# Altium footprint library LUMI_Standard_Auto_Soldering_LIB.PcbLib: 344 footprints (part 3 of 22)
Each footprint in its own frame and in the unit in brackets; x right, y up, seen from the top. Pads: shape width x height; smd on the part's side, far side on the other; paste and mask are expansions set on the pad; w line width, h text height; cw(c..) or ccw(c..) is an arc to the next point about the centre after c.
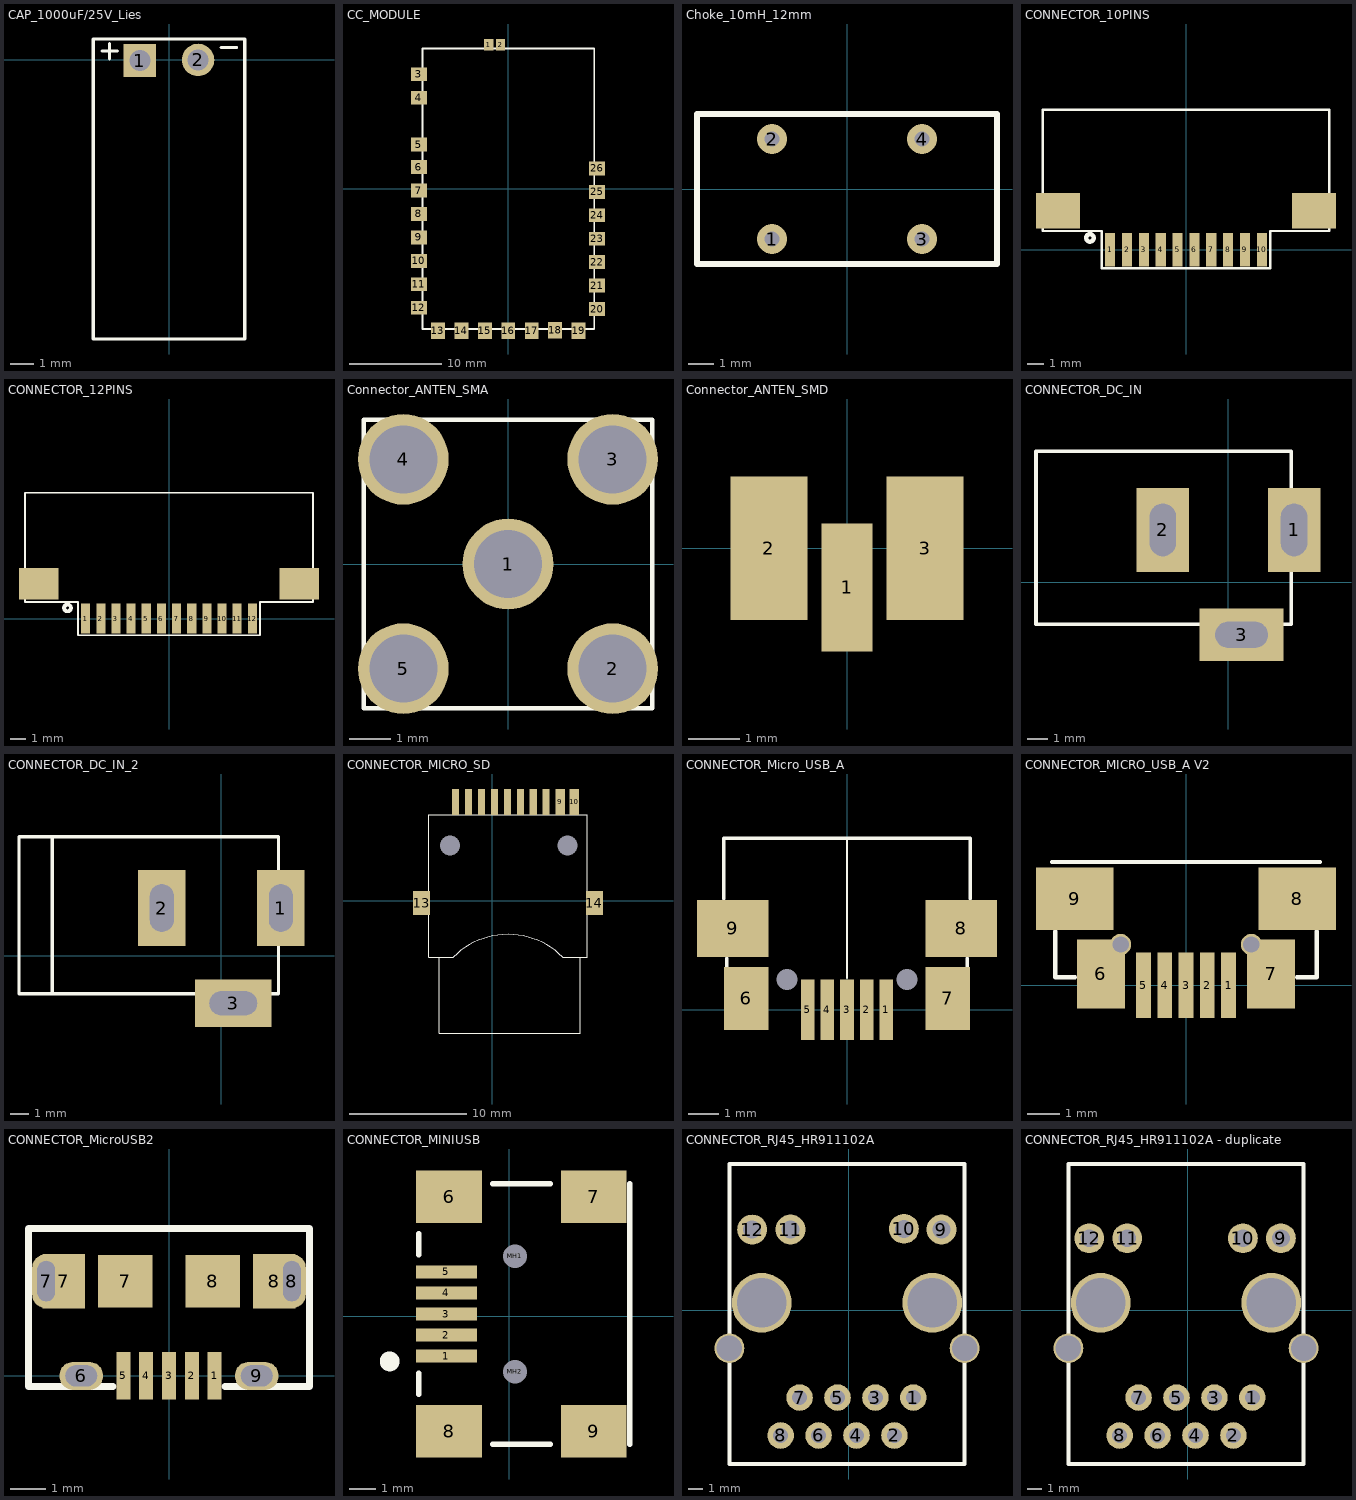
[diagram p2: the footprints below, top view; thin cyan lines are the x and y axes]

## CAP_1000uF/25V_Lies [mm]
pads (2):
  rect 1.4x1.4 hole 0.889: 1(-1.25,-0.025)
  round 1.4 hole 0.889: 2(1.25,0)
Top Overlay:
  lines w0.127: -2.887,0.375 -2.213,0.375 ; -2.55,0.038 -2.55,0.713 ; 2.238,0.525 2.913,0.525
  lines w0.15: -3.25,-12 -3.25,0.9 3.25,0.9 3.25,-12 -3.25,-12
3D body: height 11.95, standoff 0, extent -5.876,-25.1 6.1,0.9
3D body: height 5.99, standoff 0.01, extent -2.976,-12 3,0
3D body: height -0.43, standoff -5.58, extent -2.606,-11.963 2.6,0.763

## CC_MODULE [mm]
pads (26):
  rect 1x1.25 smd mask+0.07: 1(-2.13,15.6) 2(-0.86,15.6)
  rect 1.778x1.5 smd mask+0.07: 3(-9.7,12.4) 4(-9.7,9.86) 5(-9.7,4.78) 6(-9.7,2.34) 7(-9.7,-0.2) 8(-9.7,-2.74) 9(-9.7,-5.28) 10(-9.7,-7.82) 11(-9.7,-10.36) 12(-9.7,-12.9) 20(9.6,-13.04) 21(9.6,-10.5) 22(9.6,-7.96) 23(9.6,-5.42) 24(9.6,-2.88) 25(9.6,-0.34) 26(9.6,2.2)
  rect 1.5x1.778 smd mask+0.07: 13(-7.64,-15.4) 14(-5.1,-15.4) 15(-2.56,-15.4) 16(-0.02,-15.4) 17(2.52,-15.4) 18(5.06,-15.357) 19(7.6,-15.4)
Top Overlay:
  lines w0.2: -9.3,-15.2 -9.3,15.2 9.3,15.2 9.3,-15.2 -9.3,-15.2
3D body: height 2.95, standoff 0.1, extent -9.3,-15.2 9.3,15.2

## Choke_10mH_12mm [mm]
pads (4):
  round 1.2 hole 0.6 mask+0.07: 1(-3,-2) 2(-3,2) 3(3,-2) 4(3,2)
Top Overlay:
  lines w0.254: -6,-3 6,-3 6,3 -6,3 -6,-3
3D body: height 11.99, standoff 0.01, extent -5.976,-3 5.976,3

## CONNECTOR_10PINS [mm] "Dung noi mach cam ung va mach cong suat"
pads (12):
  rect 0.6x2 smd: 1(-4.5,0) 2(-3.5,0) 3(-2.5,0) 4(-1.5,0) 5(-0.5,0) 6(0.5,0) 7(1.5,0) 8(2.5,0) 9(3.5,0) 10(4.5,0)
  rect 2.6x2.1 smd: ""(-7.6,2.3) ""(7.6,2.3)
Top Overlay:
  circle w0.254: c-5.7,0.7 r0.224
  lines w0.127: -8.5,1.1 -8.5,8.3 8.5,8.3 8.5,1.1 5,1.1 5,-1.1 -5,-1.1 -5,1.1 -8.5,1.1
3D body: height 3, standoff 0, extent -8.5,-0.5 8.5,8.2

## CONNECTOR_12PINS [mm]
pads (14):
  rect 0.6x2 smd: 1(-5.5,0) 2(-4.5,0) 3(-3.5,0) 4(-2.5,0) 5(-1.5,0) 6(-0.5,0) 7(0.5,0) 8(1.5,0) 9(2.5,0) 10(3.5,0) 11(4.5,0) 12(5.5,0)
  rect 2.6x2.1 smd: ""(-8.6,2.3) ""(8.6,2.3)
Top Overlay:
  circle w0.254: c-6.7,0.7 r0.224
  lines w0.127: -9.5,1.1 -6,1.1 -6,-1.1 6,-1.1 6,1.1 9.5,1.1 9.5,8.3 -9.5,8.3 -9.5,1.1
3D body: height 3, standoff 0, extent -8.5,-0.5 8.5,8.2

## Connector_ANTEN_SMA [mm]
pads (5):
  round 2.2 hole 1.65: 1(0,0) 2(2.54,-2.54) 3(2.54,2.54) 4(-2.54,2.54)
  round 2.2 hole 1.65 mask+0.102: 5(-2.54,-2.54)
Top Overlay:
  lines w0.102: -3.5,-2.5 -3.5,-2 ; -3.5,2 -3.5,2.5 ; -3.5,-3.5 -3.5,3.5 3.5,3.5 3.5,-3.5 -3.5,-3.5
3D body: height 9.86, standoff -4.24, extent -11.55,-3.5 3.55,3.5

## Connector_ANTEN_SMD [mm]
pads (3):
  rect 1x2.5 smd: 1(0,-0.762)
  rect 1.5x2.8 smd: 2(-1.524,0) 3(1.524,0)
3D body: height 1.5, standoff 0.24, extent -1.524,-1.55 1.476,1.55

## CONNECTOR_DC_IN [mil] "Jac DC input"
height 200
pads (3):
  rect 100x160 hole 50 slot 100 at 90 deg: 1(125,100) 2(-125,100)
  rect 160x100 hole 50 slot 100 at 0 deg: 3(25,-100)
Top Overlay:
  lines w7: -366.81,-80 120,-80 120,250 -366.81,250 -366.81,-80
3D body: height 433.67, standoff -137.2, extent -410.35,-105.12 134,269.12

## CONNECTOR_DC_IN_2 [mil] "Jac DC input"
height 200
pads (3):
  rect 100x160 hole 50 slot 100 at 90 deg: 1(125,100) 2(-125,100)
  rect 160x100 hole 50 slot 100 at 0 deg: 3(25,-100)
Top Overlay:
  lines w7: -355,-80 -355,250 ; -425,-80 -425,250 120,250 120,-80 -425,-80
3D body: height 433.67, standoff -137.2, extent -410.35,-105.12 134,269.12

## CONNECTOR_MICRO_SD [mm]
pads (14):
  rect 0.6x2.2 smd: 1(4.6,8.4) 2(3.5,8.4) 3(2.4,8.4) 4(1.3,8.4) 5(0.2,8.4) 6(-0.9,8.4) 7(-2,8.4) 8(-3.1,8.4)
  rect 0.8x2.2 smd: 9(5.8,8.4) 10(7,8.4)
  round 0 hole 1.7: 11(6.4,4.7) 12(-3.6,4.7)
  rect 1.45x2 smd: 13(-6,-0.2) 14(8.7,-0.2)
Top Overlay:
  lines w0.1: -4.5,-4.8 -4.5,-11.3 7.5,-11.3 7.5,-4.8 ; -3.5,4.4 -3.2,4.7 ; -5.4,-4.8 -3.3,-4.8 cw(c1.35,-9.45) 6,-4.8 8.1,-4.8 8.1,7.3 -5.4,7.3 -5.4,-4.8
3D body: height 2.05, standoff 0.07, extent -6.6,-7.45 9.5,9.6

## CONNECTOR_Micro_USB_A [mm] "USB A connector, 4pin, For USB sing"
height 2.54
pads (11):
  rect 0.45x2 smd mask+0: 1(1.3,0) 2(0.65,0) 3(0,0) 4(-0.65,0) 5(-1.3,0)
  rect 1.475x2.1 smd: 6(-3.35,0.375) 7(3.35,0.375)
  rect 2.375x1.9 smd: 8(3.8,2.7) 9(-3.8,2.7)
  round 0 hole 0.7 paste+0 mask+0: ""(-2,1) ""(2,1)
Top Overlay:
  lines w0.076: 0,1.05 0,5.7
  lines w0.127: -4.1,3.7 -4.1,5.7 4.1,5.7 4.1,3.7 ; -4,1.7 -4,0.3 -3.4,0.3 ; 3.4,0.3 4,0.3 4,1.7
3D body: height 2.67, standoff -0.27, extent -3.99,0.25 3.99,5.68

## CONNECTOR_MICRO_USB_A V2 [mm]
pads (11):
  rect 0.45x2 smd mask+0: 1(1.3,0) 2(0.65,0) 3(0,0) 4(-0.65,0) 5(-1.3,0)
  rect 1.475x2.1 smd: 6(-2.6,0.35) 7(2.6,0.35)
  rect 2.375x1.9 smd: 8(3.4,2.65) 9(-3.4,2.65)
  round 0.65 hole 0.5 mask+0: ""(-2,1.25) ""(2,1.25)
Top Overlay:
  lines w0.127: -4.1,3.775 4.1,3.775 ; -4,1.65 -4,0.25 -3.4,0.25 ; 3.4,0.25 4,0.25 4,1.65
3D body: height 2.67, standoff -0.27, extent -3.99,0.2 3.99,5.63

## CONNECTOR_MicroUSB2 [mm]
pads (13):
  rect 0.4x1.35 smd mask+0: 1(1.3,0) 2(0.65,0) 3(0,0) 4(-0.65,0) 5(-1.3,0)
  oval 1.25x0.8 hole 0.6 slot 0.9 at 0 deg mask+0: 6(-2.5,0) 9(2.5,0)
  oval 0.8x1.55 hole 0.5 slot 1.15 at 90 deg mask+0: 7(-3.5,2.7) 8(3.5,2.7)
  rect 1.2x1.55 smd: 7(-3,2.7) 8(3,2.7)
  rect 1.55x1.5 smd: 7(-1.25,2.7) 8(1.25,2.7)
Top Overlay:
  lines w0.203: -1.6,-0.3 -4,-0.3 -4,4.2 4,4.2 4,-0.3 1.6,-0.3
3D body: height 2.68, standoff -0.63, extent -4.1,-0.17 4.1,5.26

## CONNECTOR_MINIUSB [mm] "Connector; USB Mini-B, Sinking Type, SM; 5 Position; Right Angle"
height 0.65
pads (11):
  rect 2.3x0.5 smd: 1(-2.389,-1.524) 2(-2.389,-0.724) 3(-2.389,0.076) 4(-2.389,0.876) 5(-2.389,1.676)
  rect 2.5x2 smd: 6(-2.289,4.526) 7(3.211,4.526) 8(-2.289,-4.374) 9(3.211,-4.374)
  round 0.6 hole 0.9 unplated: MH1(0.211,2.276) MH2(0.211,-2.124)
Top Overlay:
  circle w0.5: c-4.55,-1.725 r0.125
  lines w0.2: -3.439,-2.974 -3.439,-2.174 ; -3.439,2.326 -3.439,3.126 ; -0.639,-4.874 1.561,-4.874 ; -0.639,5.026 1.561,5.026 ; 4.572,-4.874 4.572,5.026
3D body: height 3.95, standoff -1, extent -3.097,-5.274 6.103,5.426

## CONNECTOR_RJ45_HR911102A [mm] "Single Port RJ45 Connector with Integrated Magnetics and LED"
pads (16):
  round 1.778 hole 1: 1(4.317,-5.837) 2(3.047,-8.377) 3(1.777,-5.837) 4(0.507,-8.377) 5(-0.763,-5.837) 6(-2.033,-8.377) 7(-3.303,-5.837) 8(-4.573,-8.377)
  round 2 hole 1.2: 9(6.197,5.413) 10(3.683,5.461) 11(-3.913,5.413) 12(-6.477,5.41)
  round 2 hole 1.7: ""(-8.003,-2.537) ""(7.747,-2.537)
  round 4 hole 3.3: ""(-5.843,0.513) ""(5.587,0.513)
Top Overlay:
  lines w0.254: -8.003,-10.287 -8.003,9.8 7.747,9.8 7.747,-10.287 -8.003,-10.287
3D body: height 13.42, standoff -3.38, extent -8.3,-10 7.7,11.3

## CONNECTOR_RJ45_HR911102A - duplicate [mm]
pads (16):
  round 1.778 hole 1: 1(4.317,-5.837) 2(3.047,-8.377) 3(1.777,-5.837) 4(0.507,-8.377) 5(-0.763,-5.837) 6(-2.033,-8.377) 7(-3.303,-5.837) 8(-4.573,-8.377)
  round 2 hole 1.2: 9(6.223,4.826) 10(3.683,4.826) 11(-4.064,4.826) 12(-6.604,4.826)
  round 2 hole 1.7: ""(-8.003,-2.537) ""(7.747,-2.537)
  round 4 hole 3.3: ""(-5.843,0.513) ""(5.587,0.513)
Top Overlay:
  lines w0.254: -8.003,-10.287 -8.003,9.8 7.747,9.8 7.747,-10.287 -8.003,-10.287
3D body: height 13.42, standoff -3.38, extent -8.3,-10 7.7,11.3